# Altium footprint library THU VIEN PCB.PCBLib: 534 footprints (part 14 of 34)
Each footprint in its own frame and in the unit in brackets; x right, y up, seen from the top. Pads: shape width x height; smd on the part's side, far side on the other; paste and mask are expansions set on the pad; w line width, h text height; cw(c..) or ccw(c..) is an arc to the next point about the centre after c.
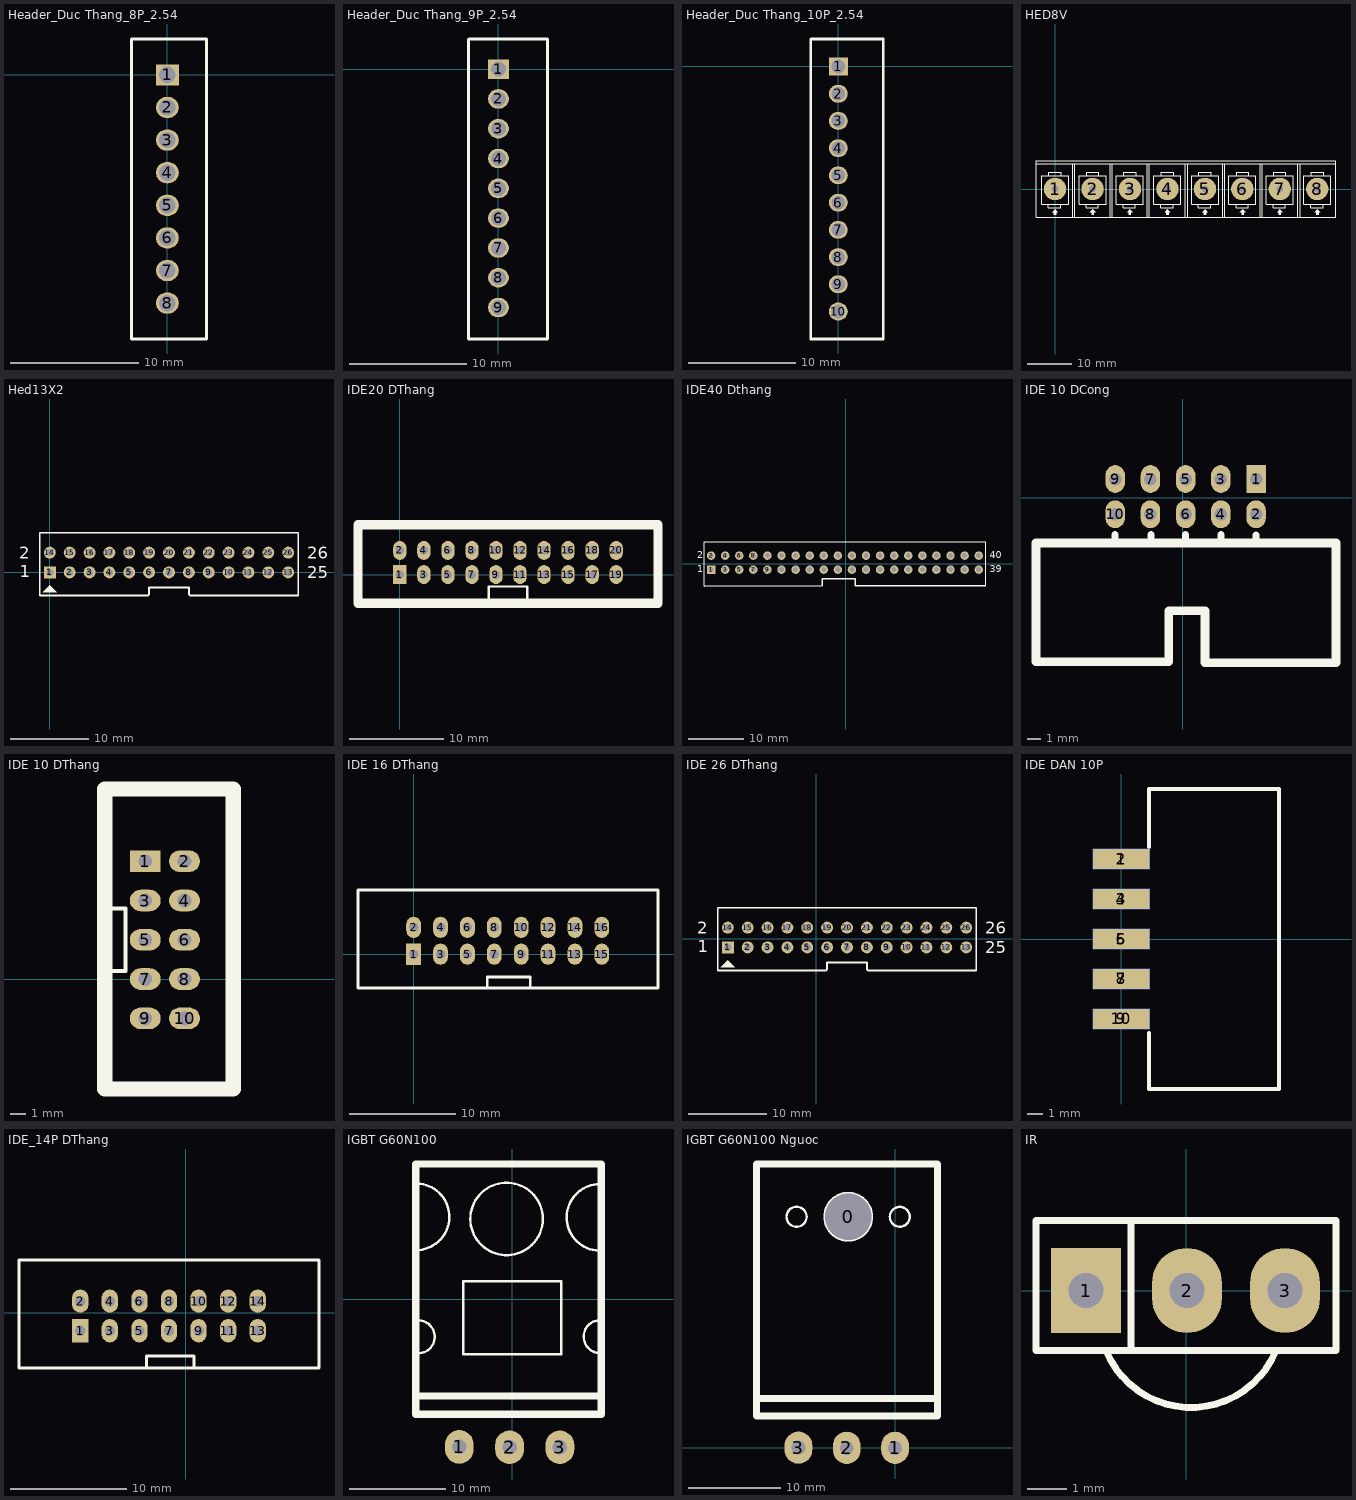
[diagram p13: the footprints below, top view; thin cyan lines are the x and y axes]

## Header_Duc Thang_8P_2.54 [mil]
pads (8):
  rect 70x65 hole 50: 1(0,0)
  oval 70x65 hole 50: 2(0,-100) 3(0,-200) 4(0,-300) 5(0,-400) 6(0,-500) 7(0,-600) 8(0,-700)
Top Overlay:
  lines w10: -110,-810 -110,110 120,110 120,-810 -110,-810
3D body "Header 10 2.54 duc thang.stp": height 550, standoff -129, extent -110,-810 116.5,110

## Header_Duc Thang_9P_2.54 [mil]
pads (9):
  rect 70x65 hole 50: 1(0,0)
  oval 70x65 hole 50: 2(0,-100) 3(0,-200) 4(0,-300) 5(0,-400) 6(0,-500) 7(0,-600) 8(0,-700) 9(0,-800)
Top Overlay:
  lines w10: -101,-905.51 -101,99 -99,101 165,101 165,-905.51 -101,-905.51

## Header_Duc Thang_10P_2.54 [mil]
pads (10):
  rect 70x65 hole 50: 1(0,0)
  oval 70x65 hole 50: 2(0,-100) 3(0,-200) 4(0,-300) 5(0,-400) 6(0,-500) 7(0,-600) 8(0,-700) 9(0,-800) 10(0,-900)
Top Overlay:
  lines w10: -101,-1001 -101,99 -99,101 165,101 165,-1001 -101,-1001
3D body "31550.stp": height 550, standoff -115, extent -98,-1000 162,100

## HED8V [mil] "Header 6"
height 300
pads (8):
  round 200 hole 60: 1(0,0) 2(333.33,0) 3(666.67,0) 4(1000,0) 5(1333.33,0) 6(1666.67,0) 7(2000,0) 8(2333.33,0)
Top Overlay:
  drawing of 107 lines, arcs and shapes, not listed

## Hed13X2 [mil] "Header 13x2,26 pin, connecter"
pads (26):
  rect 60x60 hole 36: 1(0,0)
  round 60 hole 36: 2(100,0) 3(200,0) 4(300,0) 5(400,0) 6(500,0) 7(600,0) 8(700,0) 9(800,0) 10(900,0) 11(1000,0) 12(1100,0) 13(1200,0) 14(0,100) 15(100,100) 16(200,100) 17(300,100) 18(400,100) 19(500,100) 20(600,100) 21(700,100) 22(800,100) 23(900,100) 24(1000,100) 25(1100,100) 26(1200,100)
Top Overlay:
  region: 0,-65 -35,-100 35,-100
  lines w8: -50,-115 -50,200 1250,200 1250,-115
  lines w10: -50,-115 495,-115 500,-110 500,-75 700,-75 700,-110 705,-115 1250,-115
  text "1" at -150,-25 h60
  text "2" at -155,70 h60
  text "25" at 1295,-30 h60
  text "26" at 1295,70 h60

## IDE20 DThang [mm] "Connector; Header; 5x2 Position"
pads (20):
  rect 1.4x2 hole 0.9: 1(0,0)
  oval 1.4x2 hole 0.9: 2(0,2.54) 3(2.54,0) 4(2.54,2.54) 5(5.08,0) 6(5.08,2.54) 7(7.62,0) 8(7.62,2.54) 9(10.16,0) 10(10.16,2.54) 11(12.7,0) 12(12.7,2.54) 13(15.24,0) 14(15.24,2.54) 15(17.78,0) 16(17.78,2.54) 17(20.32,0) 18(20.32,2.54) 19(22.86,0) 20(22.86,2.54)
Top Overlay:
  lines w0.254: 9.398,-2.54 9.398,-1.27 13.462,-1.27 13.462,-2.794
  lines w1: 8.28,-3.048 27.28,-3.048 27.28,5.27 8.28,5.27 ; 14.58,-3.048 -4.42,-3.048 -4.42,5.27 14.58,5.27
3D body "User Library-HDB-20.step": height 9.3, standoff -2.5, extent -5.02,-3.63 27.88,5.77

## IDE40 Dthang [mil]
pads (40):
  rect 60x60 hole 35 unplated: 1(-955.2,-43.54)
  round 60 hole 35 unplated: 2(-955.2,56.46) 3(-855.2,-43.54) 4(-855.2,56.46) 5(-755.2,-43.54) 6(-755.2,56.46) 7(-655.2,-43.54) 8(-655.2,56.46) 9(-555.2,-43.54) 10(-555.2,56.46) 11(-455.2,-43.54) 12(-455.2,56.46) 13(-355.2,-43.54) 14(-355.2,56.46) 15(-255.2,-43.54) 16(-255.2,56.46) 17(-155.2,-43.54) 18(-155.2,56.46) 19(-55.2,-43.54) 20(-55.2,56.46) 21(44.8,-43.54) 22(44.8,56.46) 23(144.8,-43.54) 24(144.8,56.46) 25(244.8,-43.54) 26(244.8,56.46) 27(344.8,-43.54) 28(344.8,56.46) 29(444.8,-43.54) 30(444.8,56.46) 31(544.8,-43.54) 32(544.8,56.46) 33(644.8,-43.54) 34(644.8,56.46) 35(744.8,-43.54) 36(744.8,56.46) 37(844.8,-43.54) 38(844.8,56.46) 39(944.8,-43.54) 40(944.8,56.46)
Top Overlay:
  lines w7.87: -1005.2,-162.44 -1005.2,155.67 994.8,155.67 994.09,-157.48
  lines w10: -1005.2,-162.44 -167.32,-157.48 -167.32,-127.95 -167.32,-108.27 68.9,-108.27 68.9,-157.48 994.09,-157.48
  text "1" at -1055.2,-63.54 h50
  text "2" at -1055.2,36.46 h50
  text "40" at 1024.8,36.46 h50
  text "39" at 1024.8,-63.54 h50

## IDE 10 DCong [mm]
pads (10):
  rect 1.4x2 hole 0.9: 1(5.283,1.346)
  oval 1.4x2 hole 0.9: 2(5.283,-1.194) 3(2.743,1.346) 4(2.743,-1.194) 5(0.203,1.346) 6(0.203,-1.194) 7(-2.337,1.346) 8(-2.337,-1.194) 9(-4.877,1.346) 10(-4.877,-1.194)
Top Overlay:
  lines w0.508: -4.877,-3.327 -4.826,-3.327 ; -4.877,-3.2 -4.877,-2.642 ; -2.286,-2.667 -2.286,-3.2 -2.261,-3.2 ; 0.203,-3.251 0.203,-2.667 ; 2.743,-2.667 2.743,-3.226 2.845,-3.226 ; 5.283,-2.692 5.283,-3.302 5.41,-3.302
  lines w0.635: 11.024,-11.913 1.6,-11.913 1.6,-8.153 -1.016,-8.153 -1.016,-11.836 -10.592,-11.836 -10.592,-3.277 11.049,-3.277 11.049,-11.887
3D body "IDC 10 CONG.step": height 8.47, standoff -2.88, extent -10.242,-11.862 10.698,1.698

## IDE 10 DThang [mm] "Connector; Header; 5x2 Position"
pads (10):
  rect 2x1.4 hole 0.9: 1(10.16,7.62)
  oval 2x1.4 hole 0.9: 2(12.7,7.62) 3(10.16,5.08) 4(12.7,5.08) 5(10.16,2.54) 6(12.7,2.54) 7(10.16,0) 8(12.7,0) 9(10.16,-2.54) 10(12.7,-2.54)
Top Overlay:
  lines w0.254: 7.874,0.508 8.89,0.508 8.89,0.762 8.89,4.572 7.874,4.572
  lines w1: 7.544,-7.112 15.85,-7.112 15.85,12.294 7.544,12.294 7.544,-7.112
3D body "IDE 10.STEP": height 9.44, standoff -3.26, extent 7.036,-7.584 16.386,12.816

## IDE 16 DThang [mm]
pads (16):
  rect 1.4x2 hole 0.9: 1(0,0)
  oval 1.4x2 hole 0.9: 2(0,2.54) 3(2.54,0) 4(2.54,2.54) 5(5.08,0) 6(5.08,2.54) 7(7.62,0) 8(7.62,2.54) 9(10.16,0) 10(10.16,2.54) 11(12.7,0) 12(12.7,2.54) 13(15.24,0) 14(15.24,2.54) 15(17.78,0) 16(17.78,2.54)
Top Overlay:
  lines w0.254: 6.964,-3.199 6.964,-2.163 11.028,-2.163 11.028,-3.199 ; -5.258,-3.2 23.089,-3.2 23.089,6.071 -5.258,6.071 -5.258,-3.2
3D body "User Library-IDC Socket Male 16pin Straight THT Goldplated 2_54mm.STEP": height 8.91, standoff -3.49, extent -5.06,-3 22.86,5.85

## IDE 26 DThang [mil]
pads (26):
  rect 60x60 hole 36: 1(-445,-45)
  round 60 hole 36: 2(-345,-45) 3(-245,-45) 4(-145,-45) 5(-45,-45) 6(55,-45) 7(155,-45) 8(255,-45) 9(355,-45) 10(455,-45) 11(555,-45) 12(655,-45) 13(755,-45) 14(-445,55) 15(-345,55) 16(-245,55) 17(-145,55) 18(-45,55) 19(55,55) 20(155,55) 21(255,55) 22(355,55) 23(455,55) 24(555,55) 25(655,55) 26(755,55)
Top Overlay:
  region: -445,-110 -480,-145 -410,-145
  lines w8: -495,-160 -495,155 805,155 805,-160
  lines w10: -495,-160 50,-160 55,-155 55,-120 255,-120 255,-155 260,-160 805,-160
  text "1" at -595,-70 h60
  text "2" at -600,25 h60
  text "25" at 850,-75 h60
  text "26" at 850,25 h60

## IDE DAN 10P [mm]
pads (10):
  rect 3.6x1.3 smd: 1(0,5.08) 3(0,2.54) 5(0,0) 7(0,-2.54) 9(0,-5.08)
  rect 3.6x1.3 smd far side: 2(0,5.08) 4(0,2.54) 6(0,0) 8(0,-2.54) 10(0,-5.08)
Top Overlay:
  lines w0.254: 1.778,-5.969 1.778,-9.525 10.033,-9.525 10.033,9.525 1.778,9.525 1.778,5.842

## IDE_14P DThang [mm]
pads (14):
  rect 1.4x2 hole 0.9: 1(-9.068,-1.549)
  oval 1.4x2 hole 0.9: 2(-9.068,0.991) 3(-6.528,-1.549) 4(-6.528,0.991) 5(-3.988,-1.549) 6(-3.988,0.991) 7(-1.448,-1.549) 8(-1.448,0.991) 9(1.092,-1.549) 10(1.092,0.991) 11(3.632,-1.549) 12(3.632,0.991) 13(6.172,-1.549) 14(6.172,0.991)
Top Overlay:
  lines w0.254: -3.374,-4.748 -3.374,-3.712 0.69,-3.712 0.69,-4.748 ; -14.326,-4.75 11.43,-4.75 11.43,4.521 -14.326,4.521 -14.326,-4.75

## IGBT G60N100 [mm]
pads (3):
  oval 3x3.5 hole 1.5: 1(-5.512,-15.342) 2(-0.279,-15.367) 3(4.953,-15.367)
Top Overlay:
  circle w0.254: c-0.595,8.382 r3.77
  lines w0.254: -10.014,5.134 ccw(c-10.014,8.6) -9.906,12.065 ; -9.66,-2.179 cw(c-9.774,-3.884) -9.652,-5.588 ; 9.017,-2.159 ccw(c9.139,-3.863) 9.025,-5.568 ; 9.017,5.08 cw(c9.125,8.545) 9.125,12.011 ; -5.08,-5.715 -5.08,1.905 5.08,1.905 5.08,-5.715 -5.08,-5.715
  lines w0.762: -10.033,-10.033 9.017,-10.033 ; -10.033,-11.938 -10.033,14.097 9.271,14.097 9.271,-11.938 -10.033,-11.938

## IGBT G60N100 Nguoc [mm]
pads (4):
  round 4 hole 5: 0(-5.08,25.019)
  oval 3x3.5 hole 1.5: 1(0,0) 2(-5.232,0) 3(-10.465,0.025)
Top Overlay:
  circle w0.254: c-10.668,25.019 r1.085
  circle w0.254: c0.508,25.019 r1.078
  circle w0.254: c-5.08,25.019 r2.572
  lines w0.762: -14.986,5.334 4.572,5.334 ; -14.986,3.429 4.572,3.429 4.572,30.734 -14.986,30.734 -14.986,3.429
3D body "TO_264 H.step": height 5.22, standoff -12.88, extent -15.494,-0.272 5.006,31.006

## IR [mil] "Receiver Infared IC"
height 200
pads (3):
  rect 70x85 hole 35: 1(-100,0)
  oval 70x85 hole 35: 2(1,0) 3(99,0)
Top Overlay:
  lines w7: -80,-60 ccw(c5,-25) 90,-60 ; -55,-60 -55,70 ; -150,-60 150,-60 150,70 -150,70 -150,-60
3D body "IR Remote TSOP44x.STEP": height 444.47, standoff -94.36, extent -118.11,-190 118.11,156.83